# Altium footprint library SMD IC Packages.PcbLib: 305 footprints (part 3 of 34) (continued)
## BGG575 [mm] "575-Ball Molded Ball Grid Array (BGG575) - Pb-Free" (continued)
Top Overlay:
  circle w0.25: c-16.15,14.605 r0.125
  region: -14.7,15.5 -15.5,14.7 -15.5,15.5
  lines w0.2: -15.5,14.7 -14.7,15.5 ; -15.5,-15.5 -15.5,15.5 15.5,15.5 15.5,-15.5 -15.5,-15.5
Mechanical 13:
  lines w0.1: -15.5,-15.5 -15.5,15.5 15.5,15.5 15.5,-15.5 -15.5,-15.5
Mechanical 15:
  lines w0.1: -0.5,0 0.5,0 ; 0,-0.5 0,0.5 ; -16.5,-16.5 -16.5,16.5 16.5,16.5 16.5,-16.5 -16.5,-16.5
3D body: height 2.6, standoff 0, extent -15.5,-15.5 15.5,15.5

## BGG728 [mm] "728-Ball Plastic Ball Grid Array (BGG728) - Pb-Free"
height 2.6
pads (728):
  round 0.6 smd: A2(-15.24,16.51) A3(-13.97,16.51) A4(-12.7,16.51) A5(-11.43,16.51) A6(-10.16,16.51) A7(-8.89,16.51) A8(-7.62,16.51) A9(-6.35,16.51) A10(-5.08,16.51) A11(-3.81,16.51) A12(-2.54,16.51) A13(-1.27,16.51) A14(0,16.51) A15(1.27,16.51) A16(2.54,16.51) A17(3.81,16.51) A18(5.08,16.51) A19(6.35,16.51) A20(7.62,16.51) A21(8.89,16.51) A22(10.16,16.51) A23(11.43,16.51) A24(12.7,16.51) A25(13.97,16.51) A26(15.24,16.51) A27(16.51,16.51) AA1(-16.51,-8.89) AA2(-15.24,-8.89) AA3(-13.97,-8.89) AA4(-12.7,-8.89) AA5(-11.43,-8.89) AA6(-10.16,-8.89) AA7(-8.89,-8.89) AA8(-7.62,-8.89) AA9(-6.35,-8.89) AA10(-5.08,-8.89) AA11(-3.81,-8.89) AA12(-2.54,-8.89) AA13(-1.27,-8.89) AA14(0,-8.89) AA15(1.27,-8.89) AA16(2.54,-8.89) AA17(3.81,-8.89) AA18(5.08,-8.89) AA19(6.35,-8.89) AA20(7.62,-8.89) AA21(8.89,-8.89) AA22(10.16,-8.89) AA23(11.43,-8.89) AA24(12.7,-8.89) AA25(13.97,-8.89) AA26(15.24,-8.89) AA27(16.51,-8.89) AB1(-16.51,-10.16) AB2(-15.24,-10.16) AB3(-13.97,-10.16) AB4(-12.7,-10.16) AB5(-11.43,-10.16) AB6(-10.16,-10.16) AB7(-8.89,-10.16) AB8(-7.62,-10.16) AB9(-6.35,-10.16) AB10(-5.08,-10.16) AB11(-3.81,-10.16) AB12(-2.54,-10.16) AB13(-1.27,-10.16) AB14(0,-10.16) AB15(1.27,-10.16) AB16(2.54,-10.16) AB17(3.81,-10.16) AB18(5.08,-10.16) AB19(6.35,-10.16) AB20(7.62,-10.16) AB21(8.89,-10.16) AB22(10.16,-10.16) AB23(11.43,-10.16) AB24(12.7,-10.16) AB25(13.97,-10.16) AB26(15.24,-10.16) AB27(16.51,-10.16) AC1(-16.51,-11.43) AC2(-15.24,-11.43) AC3(-13.97,-11.43) AC4(-12.7,-11.43) AC5(-11.43,-11.43) AC6(-10.16,-11.43) AC7(-8.89,-11.43) AC8(-7.62,-11.43) AC9(-6.35,-11.43) AC10(-5.08,-11.43) AC11(-3.81,-11.43) AC12(-2.54,-11.43) AC13(-1.27,-11.43) AC14(0,-11.43) AC15(1.27,-11.43) AC16(2.54,-11.43) AC17(3.81,-11.43) AC18(5.08,-11.43) AC19(6.35,-11.43) AC20(7.62,-11.43) AC21(8.89,-11.43) AC22(10.16,-11.43) AC23(11.43,-11.43) AC24(12.7,-11.43) AC25(13.97,-11.43) AC26(15.24,-11.43) AC27(16.51,-11.43) AD1(-16.51,-12.7) AD2(-15.24,-12.7) AD3(-13.97,-12.7) AD4(-12.7,-12.7) AD5(-11.43,-12.7) AD6(-10.16,-12.7) AD7(-8.89,-12.7) AD8(-7.62,-12.7) AD9(-6.35,-12.7) AD10(-5.08,-12.7) AD11(-3.81,-12.7) AD12(-2.54,-12.7) AD13(-1.27,-12.7) AD14(0,-12.7) AD15(1.27,-12.7) AD16(2.54,-12.7) AD17(3.81,-12.7) AD18(5.08,-12.7) AD19(6.35,-12.7) AD20(7.62,-12.7) AD21(8.89,-12.7) AD22(10.16,-12.7) AD23(11.43,-12.7) AD24(12.7,-12.7) AD25(13.97,-12.7) AD26(15.24,-12.7) AD27(16.51,-12.7) AE1(-16.51,-13.97) AE2(-15.24,-13.97) AE3(-13.97,-13.97) AE4(-12.7,-13.97) AE5(-11.43,-13.97) AE6(-10.16,-13.97) AE7(-8.89,-13.97) AE8(-7.62,-13.97) AE9(-6.35,-13.97) AE10(-5.08,-13.97) AE11(-3.81,-13.97) AE12(-2.54,-13.97) AE13(-1.27,-13.97) AE14(0,-13.97) AE15(1.27,-13.97) AE16(2.54,-13.97) AE17(3.81,-13.97) AE18(5.08,-13.97) AE19(6.35,-13.97) AE20(7.62,-13.97) AE21(8.89,-13.97) AE22(10.16,-13.97) AE23(11.43,-13.97) AE24(12.7,-13.97) AE25(13.97,-13.97) AE26(15.24,-13.97) AE27(16.51,-13.97) AF1(-16.51,-15.24) AF2(-15.24,-15.24) AF3(-13.97,-15.24) AF4(-12.7,-15.24) AF5(-11.43,-15.24) AF6(-10.16,-15.24) AF7(-8.89,-15.24) AF8(-7.62,-15.24) AF9(-6.35,-15.24) AF10(-5.08,-15.24) AF11(-3.81,-15.24) AF12(-2.54,-15.24) AF13(-1.27,-15.24) AF14(0,-15.24) AF15(1.27,-15.24) AF16(2.54,-15.24) AF17(3.81,-15.24) AF18(5.08,-15.24) AF19(6.35,-15.24) AF20(7.62,-15.24) AF21(8.89,-15.24) AF22(10.16,-15.24) AF23(11.43,-15.24) AF24(12.7,-15.24) AF25(13.97,-15.24) AF26(15.24,-15.24) AF27(16.51,-15.24) AG1(-16.51,-16.51) AG2(-15.24,-16.51) AG3(-13.97,-16.51) AG4(-12.7,-16.51) AG5(-11.43,-16.51) AG6(-10.16,-16.51) AG7(-8.89,-16.51) AG8(-7.62,-16.51) AG9(-6.35,-16.51) AG10(-5.08,-16.51) AG11(-3.81,-16.51) AG12(-2.54,-16.51) AG13(-1.27,-16.51) AG14(0,-16.51) AG15(1.27,-16.51) AG16(2.54,-16.51) AG17(3.81,-16.51) AG18(5.08,-16.51) AG19(6.35,-16.51) AG20(7.62,-16.51) AG21(8.89,-16.51) AG22(10.16,-16.51) AG23(11.43,-16.51) AG24(12.7,-16.51) AG25(13.97,-16.51) AG26(15.24,-16.51) AG27(16.51,-16.51) B1(-16.51,15.24) B2(-15.24,15.24) B3(-13.97,15.24) B4(-12.7,15.24) B5(-11.43,15.24) B6(-10.16,15.24) B7(-8.89,15.24) B8(-7.62,15.24) B9(-6.35,15.24) B10(-5.08,15.24) B11(-3.81,15.24) B12(-2.54,15.24) B13(-1.27,15.24) B14(0,15.24) B15(1.27,15.24) B16(2.54,15.24) B17(3.81,15.24) B18(5.08,15.24) B19(6.35,15.24) B20(7.62,15.24) B21(8.89,15.24) B22(10.16,15.24) B23(11.43,15.24) B24(12.7,15.24) B25(13.97,15.24) B26(15.24,15.24) B27(16.51,15.24) C1(-16.51,13.97) C2(-15.24,13.97) C3(-13.97,13.97) C4(-12.7,13.97) C5(-11.43,13.97) C6(-10.16,13.97) C7(-8.89,13.97) C8(-7.62,13.97) C9(-6.35,13.97) C10(-5.08,13.97) C11(-3.81,13.97) C12(-2.54,13.97) C13(-1.27,13.97) C14(0,13.97) C15(1.27,13.97) C16(2.54,13.97) C17(3.81,13.97) C18(5.08,13.97) C19(6.35,13.97) C20(7.62,13.97) C21(8.89,13.97) C22(10.16,13.97) C23(11.43,13.97) C24(12.7,13.97) C25(13.97,13.97) C26(15.24,13.97) C27(16.51,13.97) D1(-16.51,12.7) D2(-15.24,12.7) D3(-13.97,12.7) D4(-12.7,12.7) D5(-11.43,12.7) D6(-10.16,12.7) D7(-8.89,12.7) D8(-7.62,12.7) D9(-6.35,12.7) D10(-5.08,12.7) D11(-3.81,12.7) D12(-2.54,12.7) D13(-1.27,12.7) D14(0,12.7) D15(1.27,12.7) D16(2.54,12.7) D17(3.81,12.7) D18(5.08,12.7) D19(6.35,12.7) D20(7.62,12.7) D21(8.89,12.7) D22(10.16,12.7) D23(11.43,12.7) D24(12.7,12.7) D25(13.97,12.7) D26(15.24,12.7) D27(16.51,12.7) E1(-16.51,11.43) E2(-15.24,11.43) E3(-13.97,11.43) E4(-12.7,11.43) E5(-11.43,11.43) E6(-10.16,11.43) E7(-8.89,11.43) E8(-7.62,11.43) E9(-6.35,11.43) E10(-5.08,11.43) E11(-3.81,11.43) E12(-2.54,11.43) E13(-1.27,11.43) E14(0,11.43) E15(1.27,11.43) E16(2.54,11.43) E17(3.81,11.43) E18(5.08,11.43) E19(6.35,11.43) E20(7.62,11.43) E21(8.89,11.43) E22(10.16,11.43) E23(11.43,11.43) E24(12.7,11.43) E25(13.97,11.43) E26(15.24,11.43) E27(16.51,11.43) F1(-16.51,10.16) F2(-15.24,10.16) F3(-13.97,10.16) F4(-12.7,10.16) F5(-11.43,10.16) F6(-10.16,10.16) F7(-8.89,10.16) F8(-7.62,10.16) F9(-6.35,10.16) F10(-5.08,10.16) F11(-3.81,10.16) F12(-2.54,10.16) F13(-1.27,10.16) F14(0,10.16) F15(1.27,10.16) F16(2.54,10.16) F17(3.81,10.16) F18(5.08,10.16) F19(6.35,10.16) F20(7.62,10.16) F21(8.89,10.16) F22(10.16,10.16) F23(11.43,10.16) F24(12.7,10.16) F25(13.97,10.16) F26(15.24,10.16) F27(16.51,10.16) G1(-16.51,8.89) G2(-15.24,8.89) G3(-13.97,8.89) G4(-12.7,8.89) G5(-11.43,8.89) G6(-10.16,8.89) G7(-8.89,8.89) G8(-7.62,8.89) G9(-6.35,8.89) G10(-5.08,8.89) G11(-3.81,8.89) G12(-2.54,8.89) G13(-1.27,8.89) G14(0,8.89) G15(1.27,8.89) G16(2.54,8.89) G17(3.81,8.89) G18(5.08,8.89) G19(6.35,8.89) G20(7.62,8.89) G21(8.89,8.89) G22(10.16,8.89) G23(11.43,8.89) G24(12.7,8.89) G25(13.97,8.89) G26(15.24,8.89) G27(16.51,8.89) H1(-16.51,7.62) H2(-15.24,7.62) H3(-13.97,7.62) H4(-12.7,7.62) H5(-11.43,7.62) H6(-10.16,7.62) H7(-8.89,7.62) H8(-7.62,7.62) H9(-6.35,7.62) H10(-5.08,7.62) H11(-3.81,7.62) H12(-2.54,7.62) H13(-1.27,7.62) H14(0,7.62) H15(1.27,7.62) H16(2.54,7.62) H17(3.81,7.62) H18(5.08,7.62) H19(6.35,7.62) H20(7.62,7.62) H21(8.89,7.62) H22(10.16,7.62) H23(11.43,7.62) H24(12.7,7.62) H25(13.97,7.62) H26(15.24,7.62) H27(16.51,7.62) J1(-16.51,6.35) J2(-15.24,6.35) J3(-13.97,6.35) J4(-12.7,6.35) J5(-11.43,6.35) J6(-10.16,6.35) J7(-8.89,6.35) J8(-7.62,6.35) J9(-6.35,6.35) J10(-5.08,6.35) J11(-3.81,6.35) J12(-2.54,6.35) J13(-1.27,6.35) J14(0,6.35) J15(1.27,6.35) J16(2.54,6.35) J17(3.81,6.35) J18(5.08,6.35) J19(6.35,6.35) J20(7.62,6.35) J21(8.89,6.35) J22(10.16,6.35) J23(11.43,6.35) J24(12.7,6.35) J25(13.97,6.35) J26(15.24,6.35) J27(16.51,6.35) K1(-16.51,5.08) K2(-15.24,5.08) K3(-13.97,5.08) K4(-12.7,5.08) K5(-11.43,5.08) K6(-10.16,5.08) K7(-8.89,5.08) K8(-7.62,5.08) K9(-6.35,5.08) K10(-5.08,5.08) K11(-3.81,5.08) K12(-2.54,5.08) K13(-1.27,5.08) K14(0,5.08) K15(1.27,5.08) K16(2.54,5.08) K17(3.81,5.08) K18(5.08,5.08) K19(6.35,5.08) K20(7.62,5.08) K21(8.89,5.08) K22(10.16,5.08) K23(11.43,5.08) K24(12.7,5.08) K25(13.97,5.08) K26(15.24,5.08) K27(16.51,5.08) L1(-16.51,3.81) L2(-15.24,3.81) L3(-13.97,3.81) L4(-12.7,3.81) L5(-11.43,3.81) L6(-10.16,3.81) L7(-8.89,3.81) L8(-7.62,3.81) L9(-6.35,3.81) L10(-5.08,3.81) L11(-3.81,3.81) L12(-2.54,3.81) L13(-1.27,3.81) L14(0,3.81) L15(1.27,3.81) L16(2.54,3.81) L17(3.81,3.81) L18(5.08,3.81) L19(6.35,3.81) L20(7.62,3.81) L21(8.89,3.81) L22(10.16,3.81) L23(11.43,3.81) L24(12.7,3.81) L25(13.97,3.81) L26(15.24,3.81) L27(16.51,3.81) M1(-16.51,2.54) M2(-15.24,2.54) M3(-13.97,2.54) M4(-12.7,2.54) M5(-11.43,2.54) M6(-10.16,2.54) M7(-8.89,2.54) M8(-7.62,2.54) M9(-6.35,2.54) M10(-5.08,2.54) M11(-3.81,2.54) M12(-2.54,2.54) M13(-1.27,2.54) M14(0,2.54) M15(1.27,2.54) M16(2.54,2.54) M17(3.81,2.54) M18(5.08,2.54) M19(6.35,2.54) M20(7.62,2.54) M21(8.89,2.54) M22(10.16,2.54) M23(11.43,2.54) M24(12.7,2.54) M25(13.97,2.54) M26(15.24,2.54) M27(16.51,2.54) N1(-16.51,1.27) N2(-15.24,1.27) N3(-13.97,1.27) N4(-12.7,1.27) N5(-11.43,1.27) N6(-10.16,1.27) N7(-8.89,1.27) N8(-7.62,1.27) N9(-6.35,1.27) N10(-5.08,1.27) N11(-3.81,1.27) N12(-2.54,1.27) N13(-1.27,1.27) N14(0,1.27) N15(1.27,1.27) N16(2.54,1.27) N17(3.81,1.27) N18(5.08,1.27) N19(6.35,1.27) N20(7.62,1.27) N21(8.89,1.27) N22(10.16,1.27) N23(11.43,1.27) N24(12.7,1.27) N25(13.97,1.27) N26(15.24,1.27) N27(16.51,1.27) P1(-16.51,0) P2(-15.24,0) P3(-13.97,0) P4(-12.7,0) P5(-11.43,0) P6(-10.16,0) P7(-8.89,0) P8(-7.62,0) P9(-6.35,0) P10(-5.08,0) P11(-3.81,0) P12(-2.54,0) P13(-1.27,0) P14(0,0) P15(1.27,0) P16(2.54,0) P17(3.81,0) P18(5.08,0) P19(6.35,0) P20(7.62,0) P21(8.89,0) P22(10.16,0) P23(11.43,0) P24(12.7,0) P25(13.97,0) P26(15.24,0) P27(16.51,0) R1(-16.51,-1.27) R2(-15.24,-1.27) R3(-13.97,-1.27) R4(-12.7,-1.27) R5(-11.43,-1.27) R6(-10.16,-1.27) R7(-8.89,-1.27) R8(-7.62,-1.27) R9(-6.35,-1.27) R10(-5.08,-1.27) R11(-3.81,-1.27) R12(-2.54,-1.27) R13(-1.27,-1.27) R14(0,-1.27) R15(1.27,-1.27) R16(2.54,-1.27) R17(3.81,-1.27) R18(5.08,-1.27) R19(6.35,-1.27) R20(7.62,-1.27) R21(8.89,-1.27) R22(10.16,-1.27) R23(11.43,-1.27) R24(12.7,-1.27) R25(13.97,-1.27) R26(15.24,-1.27) R27(16.51,-1.27) T1(-16.51,-2.54) T2(-15.24,-2.54) T3(-13.97,-2.54) T4(-12.7,-2.54) T5(-11.43,-2.54) T6(-10.16,-2.54) T7(-8.89,-2.54) T8(-7.62,-2.54) T9(-6.35,-2.54) T10(-5.08,-2.54) T11(-3.81,-2.54) T12(-2.54,-2.54) T13(-1.27,-2.54) T14(0,-2.54) T15(1.27,-2.54) T16(2.54,-2.54) T17(3.81,-2.54) T18(5.08,-2.54) T19(6.35,-2.54) T20(7.62,-2.54) T21(8.89,-2.54) T22(10.16,-2.54) T23(11.43,-2.54) T24(12.7,-2.54) T25(13.97,-2.54) T26(15.24,-2.54) T27(16.51,-2.54) U1(-16.51,-3.81) U2(-15.24,-3.81) U3(-13.97,-3.81) U4(-12.7,-3.81) U5(-11.43,-3.81) U6(-10.16,-3.81) U7(-8.89,-3.81) U8(-7.62,-3.81) U9(-6.35,-3.81) U10(-5.08,-3.81) U11(-3.81,-3.81) U12(-2.54,-3.81) U13(-1.27,-3.81) U14(0,-3.81) U15(1.27,-3.81) U16(2.54,-3.81) U17(3.81,-3.81) U18(5.08,-3.81) U19(6.35,-3.81) U20(7.62,-3.81) U21(8.89,-3.81) U22(10.16,-3.81) U23(11.43,-3.81) U24(12.7,-3.81) U25(13.97,-3.81) U26(15.24,-3.81) U27(16.51,-3.81) V1(-16.51,-5.08) V2(-15.24,-5.08) V3(-13.97,-5.08) V4(-12.7,-5.08) V5(-11.43,-5.08) V6(-10.16,-5.08) V7(-8.89,-5.08) V8(-7.62,-5.08) V9(-6.35,-5.08) V10(-5.08,-5.08) V11(-3.81,-5.08) V12(-2.54,-5.08) V13(-1.27,-5.08) V14(0,-5.08) V15(1.27,-5.08) V16(2.54,-5.08) V17(3.81,-5.08) V18(5.08,-5.08) V19(6.35,-5.08) V20(7.62,-5.08) V21(8.89,-5.08) V22(10.16,-5.08) V23(11.43,-5.08) V24(12.7,-5.08) V25(13.97,-5.08) V26(15.24,-5.08) V27(16.51,-5.08) W1(-16.51,-6.35) W2(-15.24,-6.35) W3(-13.97,-6.35) W4(-12.7,-6.35) W5(-11.43,-6.35) W6(-10.16,-6.35) W7(-8.89,-6.35) W8(-7.62,-6.35) W9(-6.35,-6.35) W10(-5.08,-6.35) W11(-3.81,-6.35) W12(-2.54,-6.35) W13(-1.27,-6.35) W14(0,-6.35) W15(1.27,-6.35) W16(2.54,-6.35) W17(3.81,-6.35) W18(5.08,-6.35) W19(6.35,-6.35) W20(7.62,-6.35) W21(8.89,-6.35) W22(10.16,-6.35) W23(11.43,-6.35) W24(12.7,-6.35) W25(13.97,-6.35) W26(15.24,-6.35) W27(16.51,-6.35) Y1(-16.51,-7.62) Y2(-15.24,-7.62) Y3(-13.97,-7.62) Y4(-12.7,-7.62) Y5(-11.43,-7.62) Y6(-10.16,-7.62) Y7(-8.89,-7.62) Y8(-7.62,-7.62) Y9(-6.35,-7.62) Y10(-5.08,-7.62) Y11(-3.81,-7.62) Y12(-2.54,-7.62) Y13(-1.27,-7.62) Y14(0,-7.62) Y15(1.27,-7.62) Y16(2.54,-7.62) Y17(3.81,-7.62) Y18(5.08,-7.62) Y19(6.35,-7.62) Y20(7.62,-7.62) Y21(8.89,-7.62) Y22(10.16,-7.62) Y23(11.43,-7.62) Y24(12.7,-7.62) Y25(13.97,-7.62) Y26(15.24,-7.62) Y27(16.51,-7.62)
Top Overlay:
  circle w0.25: c-18.15,16.51 r0.125
  region: -16.51,17.5 -17.5,16.51 -17.5,17.5
  lines w0.2: -17.5,16.51 -16.51,17.5 ; -17.5,-17.5 -17.5,17.5 17.5,17.5 17.5,-17.5 -17.5,-17.5
Mechanical 13:
  lines w0.1: -17.5,-17.5 -17.5,17.5 17.5,17.5 17.5,-17.5 -17.5,-17.5
Mechanical 15:
  lines w0.1: -0.5,0 0.5,0 ; 0,-0.5 0,0.5 ; -18.5,-18.5 -18.5,18.5 18.5,18.5 18.5,-18.5 -18.5,-18.5
3D body: height 2.6, standoff 0, extent -17.5,-17.5 17.5,17.5

## CB100_L [mm] "100-Pin Ceramic Brazed Quad Flat Pack (CB100), IPC High Density"
height 3.5
pads (100):
  oval 0.4x1.9 smd: 1(0,11.3) 2(-0.635,11.3) 3(-1.27,11.3) 4(-1.905,11.3) 5(-2.54,11.3) 6(-3.175,11.3) 7(-3.81,11.3) 8(-4.445,11.3) 9(-5.08,11.3) 10(-5.715,11.3) 11(-6.35,11.3) 12(-6.985,11.3) 13(-7.62,11.3) 39(-7.62,-11.3) 40(-6.985,-11.3) 41(-6.35,-11.3) 42(-5.715,-11.3) 43(-5.08,-11.3) 44(-4.445,-11.3) 45(-3.81,-11.3) 46(-3.175,-11.3) 47(-2.54,-11.3) 48(-1.905,-11.3) 49(-1.27,-11.3) 50(-0.635,-11.3) 51(0,-11.3) 52(0.635,-11.3) 53(1.27,-11.3) 54(1.905,-11.3) 55(2.54,-11.3) 56(3.175,-11.3) 57(3.81,-11.3) 58(4.445,-11.3) 59(5.08,-11.3) 60(5.715,-11.3) 61(6.35,-11.3) 62(6.985,-11.3) 63(7.62,-11.3) 89(7.62,11.3) 90(6.985,11.3) 91(6.35,11.3) 92(5.715,11.3) 93(5.08,11.3) 94(4.445,11.3) 95(3.81,11.3) 96(3.175,11.3) 97(2.54,11.3) 98(1.905,11.3) 99(1.27,11.3) 100(0.635,11.3)
  oval 1.9x0.4 smd: 14(-11.3,7.62) 15(-11.3,6.985) 16(-11.3,6.35) 17(-11.3,5.715) 18(-11.3,5.08) 19(-11.3,4.445) 20(-11.3,3.81) 21(-11.3,3.175) 22(-11.3,2.54) 23(-11.3,1.905) 24(-11.3,1.27) 25(-11.3,0.635) 26(-11.3,0) 27(-11.3,-0.635) 28(-11.3,-1.27) 29(-11.3,-1.905) 30(-11.3,-2.54) 31(-11.3,-3.175) 32(-11.3,-3.81) 33(-11.3,-4.445) 34(-11.3,-5.08) 35(-11.3,-5.715) 36(-11.3,-6.35) 37(-11.3,-6.985) 38(-11.3,-7.62) 64(11.3,-7.62) 65(11.3,-6.985) 66(11.3,-6.35) 67(11.3,-5.715) 68(11.3,-5.08) 69(11.3,-4.445) 70(11.3,-3.81) 71(11.3,-3.175) 72(11.3,-2.54) 73(11.3,-1.905) 74(11.3,-1.27) 75(11.3,-0.635) 76(11.3,0) 77(11.3,0.635) 78(11.3,1.27) 79(11.3,1.905) 80(11.3,2.54) 81(11.3,3.175) 82(11.3,3.81) 83(11.3,4.445) 84(11.3,5.08) 85(11.3,5.715) 86(11.3,6.35) 87(11.3,6.985) 88(11.3,7.62)
Top Overlay:
  circle w0.25: c0,12.8 r0.125
  lines w0.2: -0.25,9.95 -0.25,8.45 0.25,8.45 0.25,9.95 ; -9.95,-7.62 -7.62,-9.95 7.62,-9.95 9.95,-7.62 9.95,7.62 7.62,9.95 -7.62,9.95 -9.95,7.62 -9.95,-7.62
Mechanical 13:
  lines w0.1: -9.555,-9.555 9.555,-9.555 9.555,9.555 -9.555,9.555 -9.555,-9.555
Mechanical 15:
  lines w0.1: -0.5,0 0.5,0 ; 0,-0.5 0,0.5 ; -12.35,-12.35 12.35,-12.35 12.35,12.35 -12.35,12.35 -12.35,-12.35
3D body: height 3.5, standoff 0, extent -9.555,-9.555 9.555,9.555

## CB100_M [mm] "100-Pin Ceramic Brazed Quad Flat Pack (CB100), IPC Low Density"
height 3.5
pads (100):
  oval 0.45x2.5 smd: 1(0,11.4) 2(-0.635,11.4) 3(-1.27,11.4) 4(-1.905,11.4) 5(-2.54,11.4) 6(-3.175,11.4) 7(-3.81,11.4) 8(-4.445,11.4) 9(-5.08,11.4) 10(-5.715,11.4) 11(-6.35,11.4) 12(-6.985,11.4) 13(-7.62,11.4) 39(-7.62,-11.4) 40(-6.985,-11.4) 41(-6.35,-11.4) 42(-5.715,-11.4) 43(-5.08,-11.4) 44(-4.445,-11.4) 45(-3.81,-11.4) 46(-3.175,-11.4) 47(-2.54,-11.4) 48(-1.905,-11.4) 49(-1.27,-11.4) 50(-0.635,-11.4) 51(0,-11.4) 52(0.635,-11.4) 53(1.27,-11.4) 54(1.905,-11.4) 55(2.54,-11.4) 56(3.175,-11.4) 57(3.81,-11.4) 58(4.445,-11.4) 59(5.08,-11.4) 60(5.715,-11.4) 61(6.35,-11.4) 62(6.985,-11.4) 63(7.62,-11.4) 89(7.62,11.4) 90(6.985,11.4) 91(6.35,11.4) 92(5.715,11.4) 93(5.08,11.4) 94(4.445,11.4) 95(3.81,11.4) 96(3.175,11.4) 97(2.54,11.4) 98(1.905,11.4) 99(1.27,11.4) 100(0.635,11.4)
  oval 2.5x0.45 smd: 14(-11.4,7.62) 15(-11.4,6.985) 16(-11.4,6.35) 17(-11.4,5.715) 18(-11.4,5.08) 19(-11.4,4.445) 20(-11.4,3.81) 21(-11.4,3.175) 22(-11.4,2.54) 23(-11.4,1.905) 24(-11.4,1.27) 25(-11.4,0.635) 26(-11.4,0) 27(-11.4,-0.635) 28(-11.4,-1.27) 29(-11.4,-1.905) 30(-11.4,-2.54) 31(-11.4,-3.175) 32(-11.4,-3.81) 33(-11.4,-4.445) 34(-11.4,-5.08) 35(-11.4,-5.715) 36(-11.4,-6.35) 37(-11.4,-6.985) 38(-11.4,-7.62) 64(11.4,-7.62) 65(11.4,-6.985) 66(11.4,-6.35) 67(11.4,-5.715) 68(11.4,-5.08) 69(11.4,-4.445) 70(11.4,-3.81) 71(11.4,-3.175) 72(11.4,-2.54) 73(11.4,-1.905) 74(11.4,-1.27) 75(11.4,-0.635) 76(11.4,0) 77(11.4,0.635) 78(11.4,1.27) 79(11.4,1.905) 80(11.4,2.54) 81(11.4,3.175) 82(11.4,3.81) 83(11.4,4.445) 84(11.4,5.08) 85(11.4,5.715) 86(11.4,6.35) 87(11.4,6.985) 88(11.4,7.62)
Top Overlay:
  circle w0.25: c0,13.2 r0.125
  lines w0.2: -0.25,9.75 -0.25,8.25 0.25,8.25 0.25,9.75 ; -9.75,-7.62 -7.62,-9.75 7.62,-9.75 9.75,-7.62 9.75,7.62 7.62,9.75 -7.62,9.75 -9.75,7.62 -9.75,-7.62
Mechanical 13:
  lines w0.1: -9.555,-9.555 9.555,-9.555 9.555,9.555 -9.555,9.555 -9.555,-9.555
Mechanical 15:
  lines w0.1: -0.5,0 0.5,0 ; 0,-0.5 0,0.5 ; -13.15,-13.15 13.15,-13.15 13.15,13.15 -13.15,13.15 -13.15,-13.15
3D body: height 3.5, standoff 0, extent -9.555,-9.555 9.555,9.555

## CB100_N [mm] "100-Pin Ceramic Brazed Quad Flat Pack (CB100), IPC Medium Density"
height 3.5
pads (100):
  oval 0.4x2.2 smd: 1(0,11.35) 2(-0.635,11.35) 3(-1.27,11.35) 4(-1.905,11.35) 5(-2.54,11.35) 6(-3.175,11.35) 7(-3.81,11.35) 8(-4.445,11.35) 9(-5.08,11.35) 10(-5.715,11.35) 11(-6.35,11.35) 12(-6.985,11.35) 13(-7.62,11.35) 39(-7.62,-11.35) 40(-6.985,-11.35) 41(-6.35,-11.35) 42(-5.715,-11.35) 43(-5.08,-11.35) 44(-4.445,-11.35) 45(-3.81,-11.35) 46(-3.175,-11.35) 47(-2.54,-11.35) 48(-1.905,-11.35) 49(-1.27,-11.35) 50(-0.635,-11.35) 51(0,-11.35) 52(0.635,-11.35) 53(1.27,-11.35) 54(1.905,-11.35) 55(2.54,-11.35) 56(3.175,-11.35) 57(3.81,-11.35) 58(4.445,-11.35) 59(5.08,-11.35) 60(5.715,-11.35) 61(6.35,-11.35) 62(6.985,-11.35) 63(7.62,-11.35) 89(7.62,11.35) 90(6.985,11.35) 91(6.35,11.35) 92(5.715,11.35) 93(5.08,11.35) 94(4.445,11.35) 95(3.81,11.35) 96(3.175,11.35) 97(2.54,11.35) 98(1.905,11.35) 99(1.27,11.35) 100(0.635,11.35)
  oval 2.2x0.4 smd: 14(-11.35,7.62) 15(-11.35,6.985) 16(-11.35,6.35) 17(-11.35,5.715) 18(-11.35,5.08) 19(-11.35,4.445) 20(-11.35,3.81) 21(-11.35,3.175) 22(-11.35,2.54) 23(-11.35,1.905) 24(-11.35,1.27) 25(-11.35,0.635) 26(-11.35,0) 27(-11.35,-0.635) 28(-11.35,-1.27) 29(-11.35,-1.905) 30(-11.35,-2.54) 31(-11.35,-3.175) 32(-11.35,-3.81) 33(-11.35,-4.445) 34(-11.35,-5.08) 35(-11.35,-5.715) 36(-11.35,-6.35) 37(-11.35,-6.985) 38(-11.35,-7.62) 64(11.35,-7.62) 65(11.35,-6.985) 66(11.35,-6.35) 67(11.35,-5.715) 68(11.35,-5.08) 69(11.35,-4.445) 70(11.35,-3.81) 71(11.35,-3.175) 72(11.35,-2.54) 73(11.35,-1.905) 74(11.35,-1.27) 75(11.35,-0.635) 76(11.35,0) 77(11.35,0.635) 78(11.35,1.27) 79(11.35,1.905) 80(11.35,2.54) 81(11.35,3.175) 82(11.35,3.81) 83(11.35,4.445) 84(11.35,5.08) 85(11.35,5.715) 86(11.35,6.35) 87(11.35,6.985) 88(11.35,7.62)
Top Overlay:
  circle w0.25: c0,13 r0.125
  lines w0.2: -0.25,9.85 -0.25,8.35 0.25,8.35 0.25,9.85 ; -9.85,-7.62 -7.62,-9.85 7.62,-9.85 9.85,-7.62 9.85,7.62 7.62,9.85 -7.62,9.85 -9.85,7.62 -9.85,-7.62
Mechanical 13:
  lines w0.1: -9.555,-9.555 9.555,-9.555 9.555,9.555 -9.555,9.555 -9.555,-9.555
Mechanical 15:
  lines w0.1: -0.5,0 0.5,0 ; 0,-0.5 0,0.5 ; -12.7,-12.7 12.7,-12.7 12.7,12.7 -12.7,12.7 -12.7,-12.7
3D body: height 3.5, standoff 0, extent -9.555,-9.555 9.555,9.555

## CB164_L [mm] "164-Pin Ceramic Brazed Quad Flat Pack (CB164), IPC High Density"
height 3.4
pads (164):
  oval 0.4x2 smd: 1(0,16.1) 2(-0.635,16.1) 3(-1.27,16.1) 4(-1.905,16.1) 5(-2.54,16.1) 6(-3.175,16.1) 7(-3.81,16.1) 8(-4.445,16.1) 9(-5.08,16.1) 10(-5.715,16.1) 11(-6.35,16.1) 12(-6.985,16.1) 13(-7.62,16.1) 14(-8.255,16.1) 15(-8.89,16.1) 16(-9.525,16.1) 17(-10.16,16.1) 18(-10.795,16.1) 19(-11.43,16.1) 20(-12.065,16.1) 21(-12.7,16.1) 63(-12.7,-16.1) 64(-12.065,-16.1) 65(-11.43,-16.1) 66(-10.795,-16.1) 67(-10.16,-16.1) 68(-9.525,-16.1) 69(-8.89,-16.1) 70(-8.255,-16.1) 71(-7.62,-16.1) 72(-6.985,-16.1) 73(-6.35,-16.1) 74(-5.715,-16.1) 75(-5.08,-16.1) 76(-4.445,-16.1) 77(-3.81,-16.1) 78(-3.175,-16.1) 79(-2.54,-16.1) 80(-1.905,-16.1) 81(-1.27,-16.1) 82(-0.635,-16.1) 83(0,-16.1) 84(0.635,-16.1) 85(1.27,-16.1) 86(1.905,-16.1) 87(2.54,-16.1) 88(3.175,-16.1) 89(3.81,-16.1) 90(4.445,-16.1) 91(5.08,-16.1) 92(5.715,-16.1) 93(6.35,-16.1) 94(6.985,-16.1) 95(7.62,-16.1) 96(8.255,-16.1) 97(8.89,-16.1) 98(9.525,-16.1) 99(10.16,-16.1) 100(10.795,-16.1) 101(11.43,-16.1) 102(12.065,-16.1) 103(12.7,-16.1) 145(12.7,16.1) 146(12.065,16.1) 147(11.43,16.1) 148(10.795,16.1) 149(10.16,16.1) 150(9.525,16.1) 151(8.89,16.1) 152(8.255,16.1) 153(7.62,16.1) 154(6.985,16.1) 155(6.35,16.1) 156(5.715,16.1) 157(5.08,16.1) 158(4.445,16.1) 159(3.81,16.1) 160(3.175,16.1) 161(2.54,16.1) 162(1.905,16.1) 163(1.27,16.1) 164(0.635,16.1)
  oval 2x0.4 smd: 22(-16.1,12.7) 23(-16.1,12.065) 24(-16.1,11.43) 25(-16.1,10.795) 26(-16.1,10.16) 27(-16.1,9.525) 28(-16.1,8.89) 29(-16.1,8.255) 30(-16.1,7.62) 31(-16.1,6.985) 32(-16.1,6.35) 33(-16.1,5.715) 34(-16.1,5.08) 35(-16.1,4.445) 36(-16.1,3.81) 37(-16.1,3.175) 38(-16.1,2.54) 39(-16.1,1.905) 40(-16.1,1.27) 41(-16.1,0.635) 42(-16.1,0) 43(-16.1,-0.635) 44(-16.1,-1.27) 45(-16.1,-1.905) 46(-16.1,-2.54) 47(-16.1,-3.175) 48(-16.1,-3.81) 49(-16.1,-4.445) 50(-16.1,-5.08) 51(-16.1,-5.715) 52(-16.1,-6.35) 53(-16.1,-6.985) 54(-16.1,-7.62) 55(-16.1,-8.255) 56(-16.1,-8.89) 57(-16.1,-9.525) 58(-16.1,-10.16) 59(-16.1,-10.795) 60(-16.1,-11.43) 61(-16.1,-12.065) 62(-16.1,-12.7) 104(16.1,-12.7) 105(16.1,-12.065) 106(16.1,-11.43) 107(16.1,-10.795) 108(16.1,-10.16) 109(16.1,-9.525) 110(16.1,-8.89) 111(16.1,-8.255) 112(16.1,-7.62) 113(16.1,-6.985) 114(16.1,-6.35) 115(16.1,-5.715) 116(16.1,-5.08) 117(16.1,-4.445) 118(16.1,-3.81) 119(16.1,-3.175) 120(16.1,-2.54) 121(16.1,-1.905) 122(16.1,-1.27) 123(16.1,-0.635) 124(16.1,0) 125(16.1,0.635) 126(16.1,1.27) 127(16.1,1.905) 128(16.1,2.54) 129(16.1,3.175) 130(16.1,3.81) 131(16.1,4.445) 132(16.1,5.08) 133(16.1,5.715) 134(16.1,6.35) 135(16.1,6.985) 136(16.1,7.62) 137(16.1,8.255) 138(16.1,8.89) 139(16.1,9.525) 140(16.1,10.16) 141(16.1,10.795) 142(16.1,11.43) 143(16.1,12.065) 144(16.1,12.7)
Top Overlay:
  circle w0.25: c0,17.65 r0.125
  lines w0.2: -0.25,14.7 -0.25,13.2 0.25,13.2 0.25,14.7 ; -14.7,-12.7 -12.7,-14.7 12.7,-14.7 14.7,-12.7 14.7,12.7 12.7,14.7 -12.7,14.7 -14.7,12.7 -14.7,-12.7
Mechanical 13:
  lines w0.1: -14.385,-14.385 14.385,-14.385 14.385,14.385 -14.385,14.385 -14.385,-14.385
Mechanical 15:
  lines w0.1: -0.5,0 0.5,0 ; 0,-0.5 0,0.5 ; -17.2,-17.2 17.2,-17.2 17.2,17.2 -17.2,17.2 -17.2,-17.2
3D body: height 3.4, standoff 0, extent -14.385,-14.385 14.385,14.385